# Altium footprint library myPcb.PcbLib: 145 footprints (part 1 of 10)
Each footprint in its own frame and in the unit in brackets; x right, y up, seen from the top. Pads: shape width x height; smd on the part's side, far side on the other; paste and mask are expansions set on the pad; w line width, h text height; cw(c..) or ccw(c..) is an arc to the next point about the centre after c.
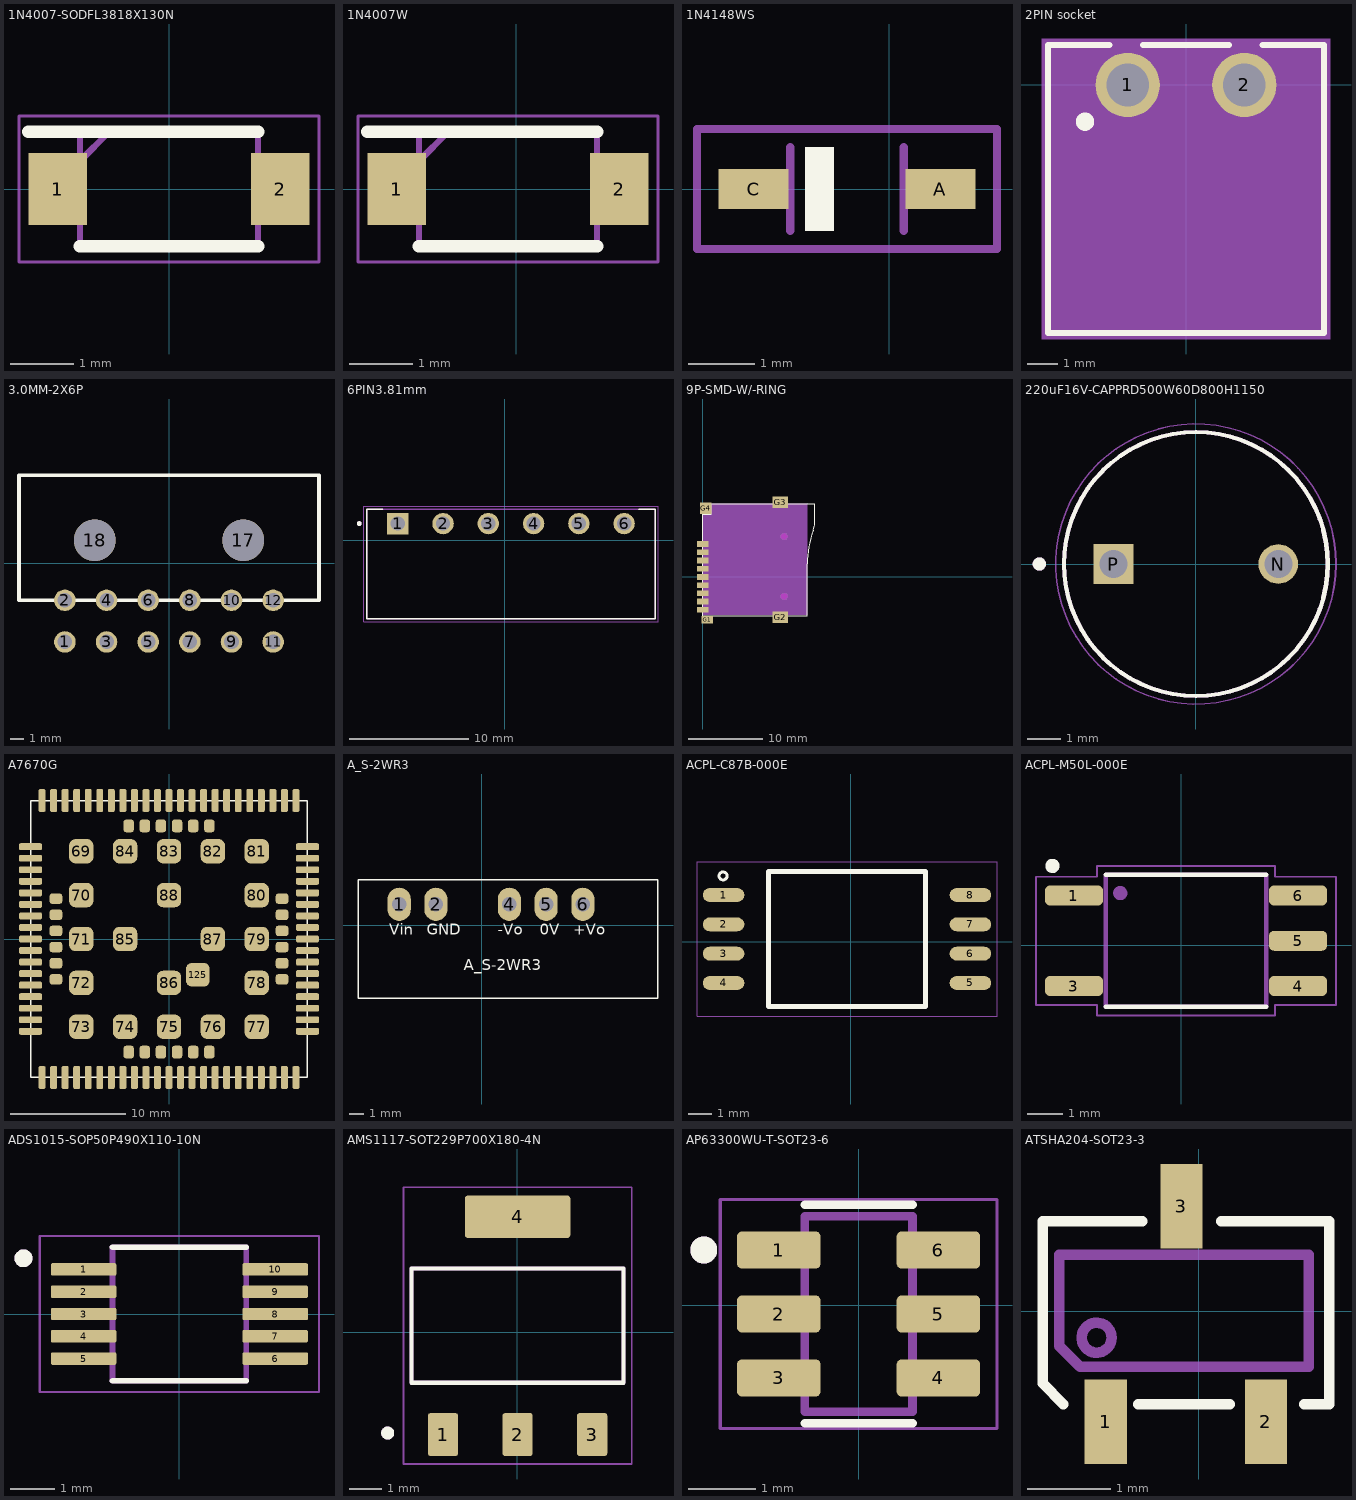
[diagram p0: the footprints below, top view; thin cyan lines are the x and y axes]

## 1N4007-SODFL3818X130N [mm] "1N4007"
pads (2):
  rect 0.92x1.13 smd: 1(-1.75,0) 2(1.75,0)
Top Overlay:
  lines w0.2: -2.21,0.9 1.4,0.9 ; -1.4,-0.9 1.4,-0.9
Mechanical 13:
  lines w0.05: -2.36,-1.15 -2.36,1.15 2.36,1.15 2.36,-1.15 -2.36,-1.15
  lines w0.1: -1.4,0.44 -0.94,0.9 ; -1.4,-0.9 -1.4,0.9 1.4,0.9 1.4,-0.9 -1.4,-0.9

## 1N4007W [mm]
pads (2):
  rect 0.92x1.13 smd: 1(-1.877,0) 2(1.623,0)
Top Overlay:
  lines w0.2: -2.337,0.9 1.273,0.9 ; -1.527,-0.9 1.273,-0.9
Mechanical 13:
  lines w0.05: -2.487,-1.15 -2.487,1.15 2.233,1.15 2.233,-1.15 -2.487,-1.15
  lines w0.1: -1.527,0.44 -1.067,0.9 ; -1.527,-0.9 -1.527,0.9 1.273,0.9 1.273,-0.9 -1.527,-0.9

## 1N4148WS [mm]
pads (2):
  rect 1.05x0.6 smd: A(0.765,0) C(-2.035,0)
Top Overlay:
  region: -0.835,-0.625 -1.26,-0.625 -1.26,0.625 -0.835,0.625
Mechanical 13:
  lines w0.127: -1.485,-0.625 -1.485,0.625 ; 0.215,-0.625 0.215,0.625
Mechanical 15:
  lines w0.127: -2.885,-0.9 1.615,-0.9 1.615,0.9 -2.885,0.9 -2.885,-0.9
3D body "step_temp.STEP": height 1.1, standoff 0, extent -1.885,-0.625 0.615,0.625

## 2PIN socket [mm] "2针插座"
pads (2):
  round 2.1 hole 1.4: 1(-1.905,0) 2(1.905,0)
Top Overlay:
  circle w0.4: c-3.3,-1.2 r0.1
  lines w0.2: -2.5,1.3 -4.505,1.3 -4.505,-8.1 4.505,-8.1 4.505,1.3 2.5,1.3 ; -1.4,1.3 1.4,1.3
Mechanical 13:
  lines w0.1: -4.405,-8 -4.405,1.2 4.405,1.2 4.405,-8 -4.405,-8
Mechanical 15:
  region: 4.705,-8.3 -4.705,-8.3 -4.705,1.5 4.705,1.5

## 3.0MM-2X6P [mm]
pads (14):
  round 1.55 hole 1.05 paste+0 mask+0.102: 1(-7.496,-5.676) 2(-7.496,-2.676) 3(-4.496,-5.676) 4(-4.496,-2.676) 5(-1.499,-5.676) 6(-1.499,-2.676) 7(1.501,-5.676) 8(1.501,-2.676) 9(4.501,-5.676) 10(4.501,-2.676) 11(7.501,-5.676) 12(7.501,-2.676)
  round 3 hole 3 paste+0 mask+0.102: 17(5.35,1.644) 18(-5.35,1.644)
Top Overlay:
  lines w0.254: -10.8,-2.676 -10.8,6.324 10.8,6.324 10.8,-2.676 -10.8,-2.676

## 6PIN3.81mm [mm]
pads (6):
  rect 1.8x1.8 hole 1.2: 1(-9.017,1.397)
  round 1.8 hole 1.2: 2(-5.207,1.397) 3(-1.397,1.397) 4(2.413,1.397) 5(6.223,1.397) 6(10.033,1.397)
Top Overlay:
  circle w0.2: c-12.267,1.397 r0.1
  lines w0.127: -10.267,2.597 -11.617,2.597 -11.617,-6.603 12.633,-6.603 12.633,2.597 11.283,2.597
Mechanical 13:
  circle w0.2: c-12.267,1.397 r0.1
  lines w0.127: -11.617,-6.603 12.633,-6.603 12.633,2.597 -11.617,2.597 -11.617,-6.603
Mechanical 15:
  lines w0.05: -11.867,-6.853 -11.867,2.847 12.883,2.847 12.883,-6.853 -11.867,-6.853

## 9P-SMD-W/-RING [mil] "TF card,Micro SD card"
pads (13):
  rect 60x30 smd paste+0 mask+2: 1(0,173.23) 2(0,129.92) 3(0,86.61) 4(0,43.31) 5(0,0) 6(0,-43.31) 7(0,-86.61) 8(0,-129.92) 9(0,-173.23)
  rect 60x40 smd paste+0 mask+2: G1(23.62,-226.22)
  rect 80x60 smd paste+0 mask+2: G2(408.39,-212.6) G3(408.39,393.7)
  rect 60x60 smd paste+0 mask+2: G4(15.43,361.46)
Top Overlay:
  lines w5: 0,-205 0,330 45,330 45,385 590,385 590,285.35 cw(c479.42,285.35) 582.75,245.98 ccw(c1050,67.99) 550,67.99 550,-205 0,-205
Keep-Out Layer:
  board cut-out: 446.63,212.6 446.63,209.12 443.97,202.69 439.05,197.76 432.61,195.1 425.65,195.1 419.22,197.76 414.3,202.69 411.63,209.12 411.63,212.6 411.63,216.08 414.3,222.51 419.22,227.43 425.65,230.1 432.61,230.1 439.05,227.43 443.97,222.51 446.63,216.08 446.63,212.6
  board cut-out: 446.63,-102.36 446.63,-105.84 443.97,-112.28 439.05,-117.2 432.61,-119.86 425.65,-119.86 419.22,-117.2 414.3,-112.28 411.63,-105.84 411.63,-102.36 411.63,-98.88 414.3,-92.45 419.22,-87.53 425.65,-84.86 432.61,-84.86 439.05,-87.53 443.97,-92.45 446.63,-98.88 446.63,-102.36
Mechanical 1:
  circle w0.2: c429.13,212.6 r17.5
  circle w0.2: c429.13,-102.36 r17.5
Mechanical 15:
  region: 0,385 550,385 550,-200 0,-200
  text ">name" at 190.07,82.91 h11.33
Multi-Layer keep-out:
  region: 446.63,212.6 446.63,209.12 443.97,202.69 439.05,197.76 432.61,195.1 425.65,195.1 419.22,197.76 414.3,202.69 411.63,209.12 411.63,212.6 411.63,216.08 414.3,222.51 419.22,227.43 425.65,230.1 432.61,230.1 439.05,227.43 443.97,222.51 446.63,216.08 446.63,212.6
  region: 446.63,-102.36 446.63,-105.84 443.97,-112.28 439.05,-117.2 432.61,-119.86 425.65,-119.86 419.22,-117.2 414.3,-112.28 411.63,-105.84 411.63,-102.36 411.63,-98.88 414.3,-92.45 419.22,-87.53 425.65,-84.86 432.61,-84.86 439.05,-87.53 443.97,-92.45 446.63,-98.88 446.63,-102.36

## 220uF16V-CAPPRD500W60D800H1150 [mm] "220uF 16V"
pads (2):
  round 1.2 hole 0.85: N(2.5,0)
  rect 1.2x1.2 hole 0.85: P(-2.5,0)
Top Overlay:
  circle w0.127: c0,0 r4
  circle w0.2: c-4.75,0 r0.1
Mechanical 13:
  circle w0.127: c0,0 r4
  circle w0.2: c-4.75,0 r0.1
Mechanical 15:
  circle w0.05: c0,0 r4.25
3D body "step_temp.STEP": height 11.5, standoff -17, extent -4,-4 4,4

## A7670G [mm]
pads (125):
  rrect50% 2x0.6 smd paste+0 mask+0.051: 1(-12,8) 2(-12,7) 3(-12,6) 4(-12,5) 5(-12,4) 6(-12,3) 7(-12,2) 8(-12,1) 9(-12,0) 10(-12,-1) 11(-12,-2) 12(-12,-3) 13(-12,-4) 14(-12,-5) 15(-12,-6) 16(-12,-7) 17(-12,-8) 35(12,-8) 36(12,-7) 37(12,-6) 38(12,-5) 39(12,-4) 40(12,-3) 41(12,-2) 42(12,-1) 43(12,0) 44(12,1) 45(12,2) 46(12,3) 47(12,4) 48(12,5) 49(12,6) 50(12,7) 51(12,8)
  rrect50% 0.6x2 smd paste+0 mask+0.051: 18(-8,-12) 19(-7,-12) 20(-6,-12) 21(-5,-12) 22(-4,-12) 23(-3,-12) 24(-2,-12) 25(-1,-12) 26(0,-12) 27(1,-12) 28(2,-12) 29(3,-12) 30(4,-12) 31(5,-12) 32(6,-12) 33(7,-12) 34(8,-12) 52(8,12) 53(7,12) 54(6,12) 55(5,12) 56(4,12) 57(3,12) 58(2,12) 59(1,12) 60(0,12) 61(-1,12) 62(-2,12) 63(-3,12) 64(-4,12) 65(-5,12) 66(-6,12) 67(-7,12) 68(-8,12) 89(-11,-12) 90(-10,-12) 91(-9,-12) 92(9,-12) 93(10,-12) 94(11,-12) 95(11,12) 96(10,12) 97(9,12) 98(-9,12) 99(-10,12) 100(-11,12)
  rrect50% 2.1x2.1 smd paste+0 mask+0.051: 69(-7.6,7.6) 70(-7.6,3.8) 71(-7.6,0) 72(-7.6,-3.8) 73(-7.6,-7.6) 74(-3.8,-7.6) 75(0,-7.6) 76(3.8,-7.6) 77(7.6,-7.6) 78(7.6,-3.8) 79(7.6,0) 80(7.6,3.8) 81(7.6,7.6) 82(3.8,7.6) 83(0,7.6) 84(-3.8,7.6) 85(-3.8,0) 86(0,-3.8) 87(3.8,0) 88(0,3.8)
  rrect50% 1.1x0.9 smd paste+0 mask+0.051: 101(-9.8,3.5) 102(-9.8,2.1) 103(-9.8,0.7) 104(-9.8,-0.7) 105(-9.8,-2.1) 106(-9.8,-3.5) 113(9.8,-3.5) 114(9.8,-2.1) 115(9.8,-0.7) 116(9.8,0.7) 117(9.8,2.1) 118(9.8,3.5)
  rrect50% 0.9x1.1 smd paste+0 mask+0.051: 107(-3.5,-9.8) 108(-2.1,-9.8) 109(-0.7,-9.8) 110(0.7,-9.8) 111(2.1,-9.8) 112(3.5,-9.8) 119(3.5,9.8) 120(2.1,9.8) 121(0.7,9.8) 122(-0.7,9.8) 123(-2.1,9.8) 124(-3.5,9.8)
  rrect50% 2.05x2.05 smd paste+0 mask+0.051: 125(2.5,-3.1)
Top Overlay:
  lines w0.127: -12,-12 12,-12 12,12 -12,12 -12,-12
Top Solder:
  region: -10.7,8 -9.8,7.1 -9.7,7 -9.7,9

## A_S-2WR3 [mm] "A1212S-2WR3"
pads (5):
  oval 1.6x2.3 hole 1: 1(-5.726,1.454) 2(-3.186,1.454) 4(1.894,1.454) 5(4.434,1.454) 6(6.974,1.454)
Top Overlay:
  lines w0.1: -8.576,-5.046 12.174,-5.046 12.174,3.154 -8.576,3.154 -8.576,-5.046
  text "A_S-2WR3" at -1.249,-3.107 h0.76
  text "-Vo" at 1.074,-0.648 h0.76
  text "GND" at -3.828,-0.653 h0.76
  text "Vin" at -6.404,-0.658 h0.76
  text "0V" at 4,-0.658 h0.76
  text "+Vo" at 6.321,-0.638 h0.76
3D body "A_S-2WR3.stp": height 10.16, standoff -4.1, extent -7.959,-4.636 11.691,2.414

## ACPL-C87B-000E [mm]
pads (8):
  oval 1.8x0.6 smd: 1(-5.521,2.018) 2(-5.521,0.748) 3(-5.521,-0.522) 4(-5.521,-1.792) 5(5.179,-1.792) 6(5.179,-0.522) 7(5.179,0.748) 8(5.179,2.018)
Top Overlay:
  circle w0.127: c-5.541,2.846 r0.173
  lines w0.2: -3.575,-2.812 3.232,-2.812 3.232,3.038 -3.575,3.038 -3.575,-2.812
Mechanical 15:
  lines w0.05: -6.671,-3.237 6.329,-3.237 6.329,3.463 -6.671,3.463 -6.671,-3.237

## ACPL-M50L-000E [mm]
pads (5):
  rrect50% 1.63x0.56 smd: 1(-3.018,1.397) 3(-3.018,-1.143) 4(3.272,-1.143) 5(3.272,0.127) 6(3.272,1.397)
Top Overlay:
  circle w0.2: c-3.623,2.227 r0.1
  lines w0.127: -2.123,-1.723 2.377,-1.723 ; -2.123,1.977 2.377,1.977
Mechanical 13:
  circle w0.2: c-1.718,1.465 r0.1
  lines w0.127: -2.123,-1.723 2.377,-1.723 2.377,1.977 -2.123,1.977 -2.123,-1.723
Mechanical 15:
  lines w0.05: -4.083,-1.673 -2.373,-1.673 -2.373,-1.973 2.627,-1.973 2.627,-1.673 4.337,-1.673 4.337,1.927 2.627,1.927 2.627,2.227 -2.373,2.227 -2.373,1.927 -4.083,1.927 -4.083,-1.673

## ADS1015-SOP50P490X110-10N [mm] "ADS1015"
pads (10):
  rrect25% 1.47x0.28 smd: 1(-2.15,1) 2(-2.15,0.5) 3(-2.15,0) 4(-2.15,-0.5) 5(-2.15,-1) 6(2.15,-1) 7(2.15,-0.5) 8(2.15,0) 9(2.15,0.5) 10(2.15,1)
Top Overlay:
  circle w0.2: c-3.5,1.25 r0.1
  lines w0.127: -1.5,-1.5 1.5,-1.5 ; -1.5,1.5 1.5,1.5
Mechanical 13:
  circle w0.2: c-3.5,1.25 r0.1
  lines w0.127: -1.5,-1.5 1.5,-1.5 1.5,1.5 -1.5,1.5 -1.5,-1.5
Mechanical 15:
  lines w0.05: -3.135,-1.75 3.135,-1.75 3.135,1.75 -3.135,1.75 -3.135,-1.75

## AMS1117-SOT229P700X180-4N [mm] "AMS1117-5，AMS1117-3.3"
pads (4):
  rrect15% 0.93x1.31 smd: 1(-2.283,-3.149) 2(0.007,-3.149) 3(2.297,-3.149)
  rrect15% 3.24x1.31 smd: 4(0.007,3.541)
Top Overlay:
  circle w0.2: c-3.983,-3.104 r0.1
  lines w0.127: -3.245,-1.556 -3.245,1.949 3.26,1.949 3.26,-1.556 -3.245,-1.556
Mechanical 13:
  circle w0.2: c-3.983,-3.104 r0.1
  lines w0.127: -3.245,-1.556 -3.245,1.949 3.26,1.949 3.26,-1.556 -3.245,-1.556
Mechanical 15:
  lines w0.05: -3.495,-4.054 -3.495,4.446 3.51,4.446 3.51,-4.054 -3.495,-4.054
3D body "step_temp.STEP": height 1.8, standoff 0, extent -3.244,-3.302 3.259,3.695

## AP63300WU-T-SOT23-6 [mm] "AP63300WU-T"
pads (6):
  rrect25% 1.24x0.55 smd: 1(-1.185,0.823) 2(-1.185,-0.127) 3(-1.185,-1.077) 4(1.185,-1.077) 5(1.185,-0.127) 6(1.185,0.823)
Top Overlay:
  circle w0.2: c-2.3,0.823 r0.1
  lines w0.127: -0.8,-1.747 0.8,-1.747 ; -0.8,1.493 0.8,1.493
Mechanical 13:
  circle w0.2: c-2.3,0.823 r0.1
  lines w0.127: -0.8,-1.577 -0.8,1.323 0.8,1.323 0.8,-1.577 -0.8,-1.577
Mechanical 15:
  lines w0.05: -2.055,-1.827 -2.055,1.573 2.055,1.573 2.055,-1.827 -2.055,-1.827

## ATSHA204-SOT23-3 [mil] "ATSHA204"
pads (3):
  rect 20x40 smd: 1(-44.19,-52.29) 2(31.68,-52.29) 3(-8.32,49.84)
Top Overlay:
  lines w5: -64.22,-43.94 -74.07,-34.1 -74.07,42.68 -26.82,42.68 ; -28.79,-43.94 14.52,-43.94 ; 10.58,42.68 61.76,42.68 61.76,-43.94 49.95,-43.94
Mechanical 13:
  circle w5: c-48.48,-12.44 r7.1
  lines w5: -66.19,-16.38 -66.19,26.93 51.92,26.93 51.92,-26.22 -56.35,-26.22 -66.19,-16.38